# Altium integrated library LEMO Unipole And Multipole Type Connectors.IntLib: 1566 symbols (part 9 of 13) (continued)
## PKB.M0.8GL.NG (continued)
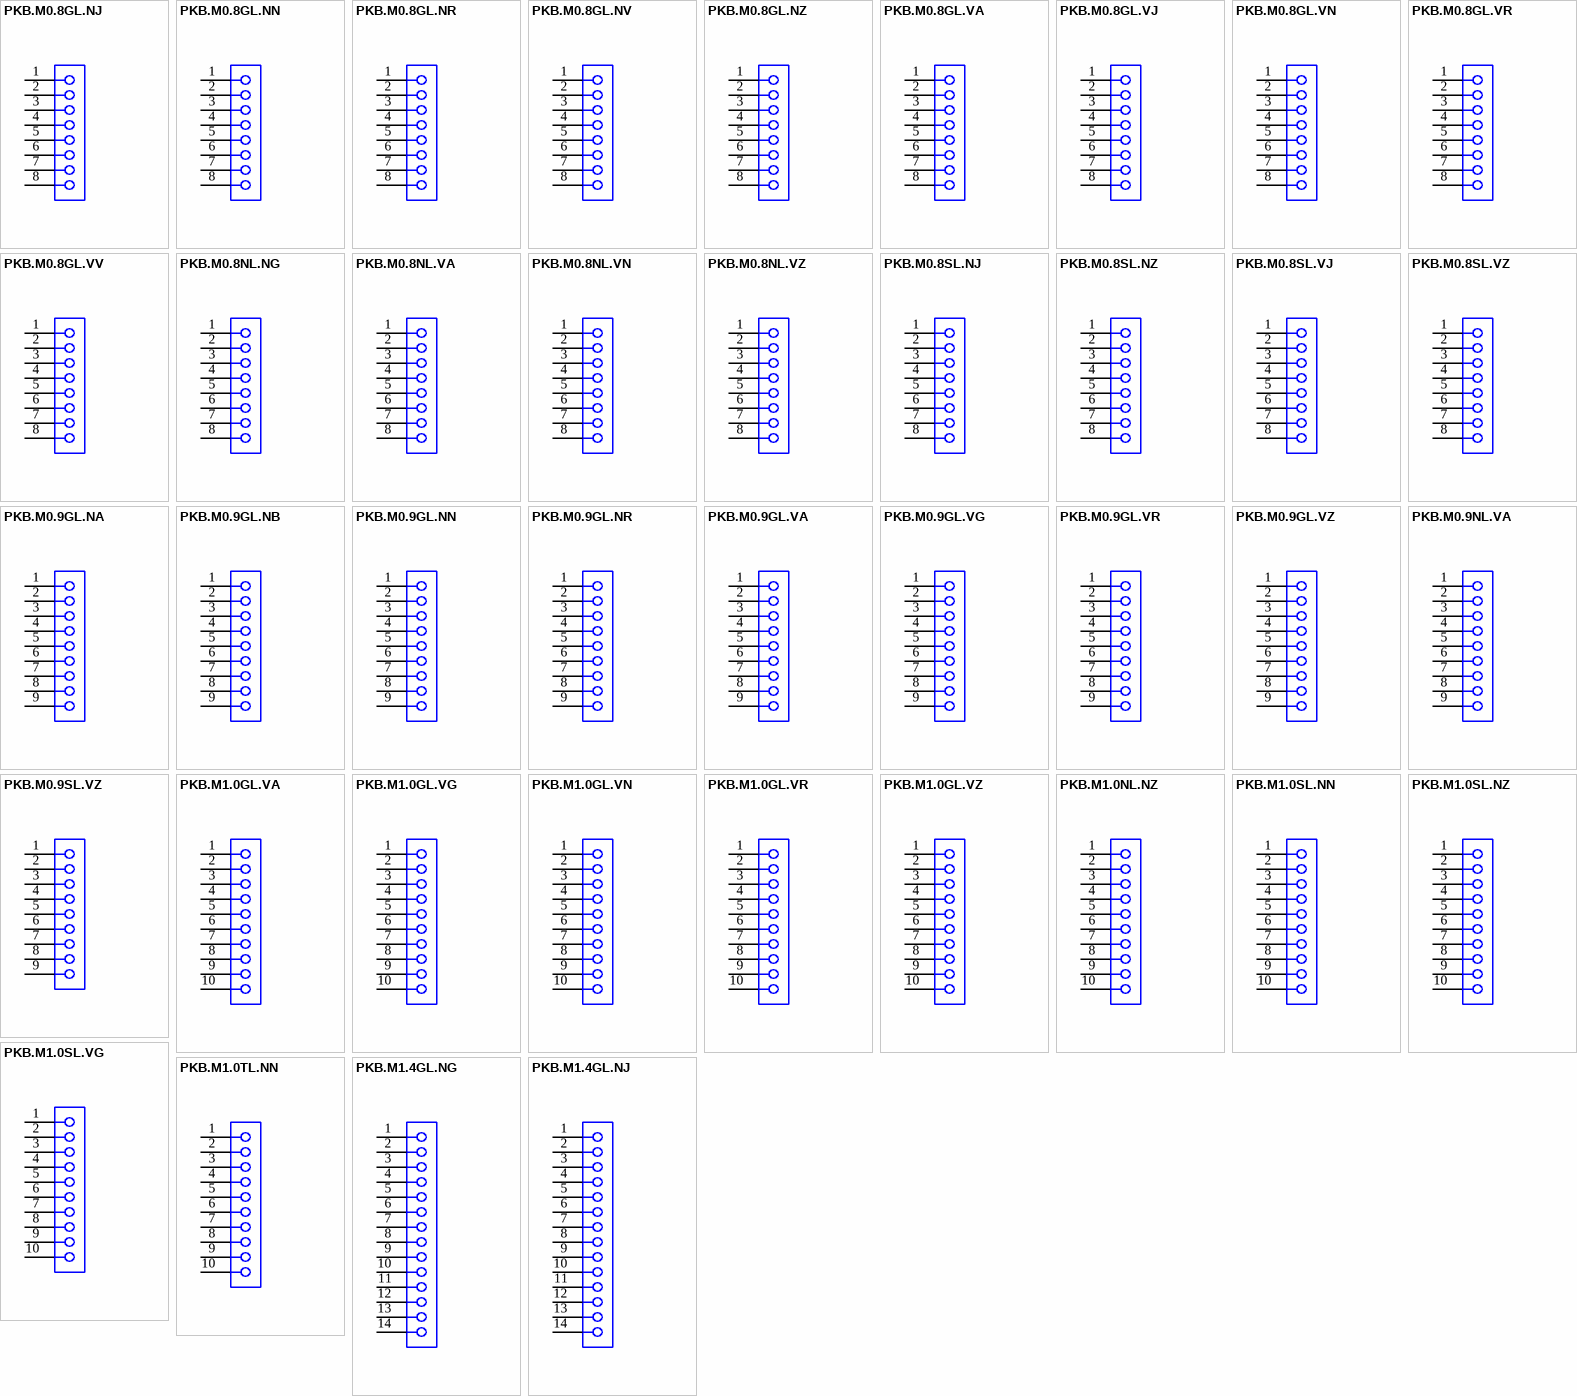
[diagram p29: symbols PKB.M0.8GL.NJ to PKB.M1.4GL.NJ]

## PKB.M0.8GL.NJ
designator J?
Fixed receptacle with two nuts (back panel mounting), straight print contacts, Key (B), P series, Multipole Type with 8 Contacts; Manufacturer: LEMO; PartNumber: PKB.M0.8GL.NJ; Number of contacts: 8; Contact Diameter: 0.7 mm; Test voltage (kV rms) Contact-Contact: 1.05; Rated Current(A): 5; DatasheetVersion: Jun-14; PackageReference: PKB.M0.8GL.NJ; PackageDescription: Fixed receptacle with two nuts (back panel mounting), straight print contacts, Key(B) for Printed Circuit; Supplier 1: Mouser; Supplier Part Number 1: 736-PKB.M0.8GL.NJ; Supplier 2: Digi-Key; Supplier Part Number 2: PKB.M0.8GL.NJ-ND; ComponentLink1Description: Manufacturer URL; ComponentLink1URL: http://www.lemo.com; ComponentLink2Description: Datasheet; ComponentLink2URL: http://intra.lemo.ch/catalog/ROW/UK_English/P_series_catalog.pdf
footprint PKB.M0.8GL.NJ (Socket, Female, Height 33.5 mm, Through hole)
pins: 1, 2, 3, 4, 5, 6, 7, 8

## PKB.M0.8GL.NN
designator J?
Fixed receptacle with two nuts (back panel mounting), straight print contacts, Key (B), P series, Multipole Type with 8 Contacts; Manufacturer: LEMO; PartNumber: PKB.M0.8GL.NN; Number of contacts: 8; Contact Diameter: 0.7 mm; Test voltage (kV rms) Contact-Contact: 1.05; Rated Current(A): 5; DatasheetVersion: Jun-14; PackageReference: PKB.M0.8GL.NN; PackageDescription: Fixed receptacle with two nuts (back panel mounting), straight print contacts, Key(B) for Printed Circuit; ComponentLink1Description: Manufacturer URL; ComponentLink1URL: http://www.lemo.com; ComponentLink2Description: Datasheet; ComponentLink2URL: http://intra.lemo.ch/catalog/ROW/UK_English/P_series_catalog.pdf
footprint PKB.M0.8GL.NN (Socket, Female, Height 33.5 mm, Through hole)
pins: 1, 2, 3, 4, 5, 6, 7, 8

## PKB.M0.8GL.NR
designator J?
Fixed receptacle with two nuts (back panel mounting), straight print contacts, Key (B), P series, Multipole Type with 8 Contacts; Manufacturer: LEMO; PartNumber: PKB.M0.8GL.NR; Number of contacts: 8; Contact Diameter: 0.7 mm; Test voltage (kV rms) Contact-Contact: 1.05; Rated Current(A): 5; DatasheetVersion: Jun-14; PackageReference: PKB.M0.8GL.NR; PackageDescription: Fixed receptacle with two nuts (back panel mounting), straight print contacts, Key(B) for Printed Circuit; ComponentLink1Description: Manufacturer URL; ComponentLink1URL: http://www.lemo.com; ComponentLink2Description: Datasheet; ComponentLink2URL: http://intra.lemo.ch/catalog/ROW/UK_English/P_series_catalog.pdf
footprint PKB.M0.8GL.NR (Socket, Female, Height 33.5 mm, Through hole)
pins: 1, 2, 3, 4, 5, 6, 7, 8

## PKB.M0.8GL.NV
designator J?
Fixed receptacle with two nuts (back panel mounting), straight print contacts, Key (B), P series, Multipole Type with 8 Contacts; Manufacturer: LEMO; PartNumber: PKB.M0.8GL.NV; Number of contacts: 8; Contact Diameter: 0.7 mm; Test voltage (kV rms) Contact-Contact: 1.05; Rated Current(A): 5; DatasheetVersion: Jun-14; PackageReference: PKB.M0.8GL.NV; PackageDescription: Fixed receptacle with two nuts (back panel mounting), straight print contacts, Key(B) for Printed Circuit; ComponentLink1Description: Manufacturer URL; ComponentLink1URL: http://www.lemo.com; ComponentLink2Description: Datasheet; ComponentLink2URL: http://intra.lemo.ch/catalog/ROW/UK_English/P_series_catalog.pdf
footprint PKB.M0.8GL.NV (Socket, Female, Height 33.5 mm, Through hole)
pins: 1, 2, 3, 4, 5, 6, 7, 8

## PKB.M0.8GL.NZ
designator J?
Fixed receptacle with 1 nut (without 2nd front nut), Key (B), P series, Multipole Type with 8 Contacts; Manufacturer: LEMO; PartNumber: PKB.M0.8GL.NZ; Number of contacts: 8; Contact Diameter: 0.7 mm; Test voltage (kV rms) Contact-Contact: 1.05; Rated Current(A): 5; DatasheetVersion: Jun-14; PackageReference: PKB.M0.8GL.NZ; PackageDescription: Fixed receptacle with 1 nut (without 2nd front nut), Key(B) for Printed Circuit; Supplier 1: Mouser; Supplier Part Number 1: 736-PKB.M0.8GL.NZ; Supplier 2: Digi-Key; Supplier Part Number 2: PKB.M0.8GL.NZ-ND; ComponentLink1Description: Manufacturer URL; ComponentLink1URL: http://www.lemo.com; ComponentLink2Description: Datasheet; ComponentLink2URL: http://intra.lemo.ch/catalog/ROW/UK_English/P_series_catalog.pdf
footprint PKB.M0.8GL.NZ (Socket, Female, Height 25 mm, Through hole)
pins: 1, 2, 3, 4, 5, 6, 7, 8

## PKB.M0.8GL.VA
designator J?
Fixed receptacle with two nuts (back panel mounting), 90° print contacts, Key (B), P series, Multipole Type with 8 Contacts; Manufacturer: LEMO; PartNumber: PKB.M0.8GL.VA; Number of contacts: 8; Contact Diameter: 0.7 mm; Test voltage (kV rms) Contact-Contact: 1.05; Rated Current(A): 5; DatasheetVersion: Jun-14; PackageReference: PKB.M0.8GL.VA; PackageDescription: Fixed receptacle with two nuts (back panel mounting), 90° print contacts, Key(B) for Printed Circuit; ComponentLink1Description: Manufacturer URL; ComponentLink1URL: http://www.lemo.com; ComponentLink2Description: Datasheet; ComponentLink2URL: http://intra.lemo.ch/catalog/ROW/UK_English/P_series_catalog.pdf
footprint PKB.M0.8GL.VA (Socket, Female, Through hole)
pins: 1, 2, 3, 4, 5, 6, 7, 8

## PKB.M0.8GL.VJ
designator J?
Fixed receptacle with two nuts (back panel mounting), 90° print contacts, Key (B), P series, Multipole Type with 8 Contacts; Manufacturer: LEMO; PartNumber: PKB.M0.8GL.VJ; Number of contacts: 8; Contact Diameter: 0.7 mm; Test voltage (kV rms) Contact-Contact: 1.05; Rated Current(A): 5; DatasheetVersion: Jun-14; PackageReference: PKB.M0.8GL.VJ; PackageDescription: Fixed receptacle with two nuts (back panel mounting), 90° print contacts, Key(B) for Printed Circuit; ComponentLink1Description: Manufacturer URL; ComponentLink1URL: http://www.lemo.com; ComponentLink2Description: Datasheet; ComponentLink2URL: http://intra.lemo.ch/catalog/ROW/UK_English/P_series_catalog.pdf
footprint PKB.M0.8GL.VJ (Socket, Female, Height 33.5 mm, Through hole)
pins: 1, 2, 3, 4, 5, 6, 7, 8

## PKB.M0.8GL.VN
designator J?
Fixed receptacle with two nuts (back panel mounting), 90° print contacts, Key (B), P series, Multipole Type with 8 Contacts; Manufacturer: LEMO; PartNumber: PKB.M0.8GL.VN; Number of contacts: 8; Contact Diameter: 0.7 mm; Test voltage (kV rms) Contact-Contact: 1.05; Rated Current(A): 5; DatasheetVersion: Jun-14; PackageReference: PKB.M0.8GL.VN; PackageDescription: Fixed receptacle with two nuts (back panel mounting), 90° print contacts, Key(B) for Printed Circuit; ComponentLink1Description: Manufacturer URL; ComponentLink1URL: http://www.lemo.com; ComponentLink2Description: Datasheet; ComponentLink2URL: http://intra.lemo.ch/catalog/ROW/UK_English/P_series_catalog.pdf
footprint PKB.M0.8GL.VN (Socket, Female, Height 33.5 mm, Through hole)
pins: 1, 2, 3, 4, 5, 6, 7, 8

## PKB.M0.8GL.VR
designator J?
Fixed receptacle with two nuts (back panel mounting), 90° print contacts, Key (B), P series, Multipole Type with 8 Contacts; Manufacturer: LEMO; PartNumber: PKB.M0.8GL.VR; Number of contacts: 8; Contact Diameter: 0.7 mm; Test voltage (kV rms) Contact-Contact: 1.05; Rated Current(A): 5; DatasheetVersion: Jun-14; PackageReference: PKB.M0.8GL.VR; PackageDescription: Fixed receptacle with two nuts (back panel mounting), 90° print contacts, Key(B) for Printed Circuit; ComponentLink1Description: Manufacturer URL; ComponentLink1URL: http://www.lemo.com; ComponentLink2Description: Datasheet; ComponentLink2URL: http://intra.lemo.ch/catalog/ROW/UK_English/P_series_catalog.pdf
footprint PKB.M0.8GL.VR (Socket, Female, Height 33.5 mm, Through hole)
pins: 1, 2, 3, 4, 5, 6, 7, 8

## PKB.M0.8GL.VV
designator J?
Fixed receptacle with two nuts (back panel mounting), 90° print contacts, Key (B), P series, Multipole Type with 8 Contacts; Manufacturer: LEMO; PartNumber: PKB.M0.8GL.VV; Number of contacts: 8; Contact Diameter: 0.7 mm; Test voltage (kV rms) Contact-Contact: 1.05; Rated Current(A): 5; DatasheetVersion: Jun-14; PackageReference: PKB.M0.8GL.VV; PackageDescription: Fixed receptacle with two nuts (back panel mounting), 90° print contacts, Key(B) for Printed Circuit; ComponentLink1Description: Manufacturer URL; ComponentLink1URL: http://www.lemo.com; ComponentLink2Description: Datasheet; ComponentLink2URL: http://intra.lemo.ch/catalog/ROW/UK_English/P_series_catalog.pdf
footprint PKB.M0.8GL.VV (Socket, Female, Height 33.5 mm, Through hole)
pins: 1, 2, 3, 4, 5, 6, 7, 8

## PKB.M0.8NL.NG
designator J?
Fixed receptacle with two nuts (back panel mounting), straight print contacts, Key (B), P series, Multipole Type with 8 Contacts; Manufacturer: LEMO; PartNumber: PKB.M0.8NL.NG; Number of contacts: 8; Contact Diameter: 0.7 mm; Test voltage (kV rms) Contact-Contact: 1.05; Rated Current(A): 5; DatasheetVersion: Jun-14; PackageReference: PKB.M0.8NL.NG; PackageDescription: Fixed receptacle with two nuts (back panel mounting), straight print contacts, Key(B) for Printed Circuit; ComponentLink1Description: Manufacturer URL; ComponentLink1URL: http://www.lemo.com; ComponentLink2Description: Datasheet; ComponentLink2URL: http://intra.lemo.ch/catalog/ROW/UK_English/P_series_catalog.pdf
footprint PKB.M0.8NL.NG (Socket, Female, Height 33.5 mm, Through hole)
pins: 1, 2, 3, 4, 5, 6, 7, 8

## PKB.M0.8NL.VA
designator J?
Fixed receptacle with two nuts (back panel mounting), 90° print contacts, Key (B), P series, Multipole Type with 8 Contacts; Manufacturer: LEMO; PartNumber: PKB.M0.8NL.VA; Number of contacts: 8; Contact Diameter: 0.7 mm; Test voltage (kV rms) Contact-Contact: 1.05; Rated Current(A): 5; DatasheetVersion: Jun-14; PackageReference: PKB.M0.8NL.VA; PackageDescription: Fixed receptacle with two nuts (back panel mounting), 90° print contacts, Key(B) for Printed Circuit; ComponentLink1Description: Manufacturer URL; ComponentLink1URL: http://www.lemo.com; ComponentLink2Description: Datasheet; ComponentLink2URL: http://intra.lemo.ch/catalog/ROW/UK_English/P_series_catalog.pdf
footprint PKB.M0.8NL.VA (Socket, Female, Height 33.5 mm, Through hole)
pins: 1, 2, 3, 4, 5, 6, 7, 8

## PKB.M0.8NL.VN
designator J?
Fixed receptacle with two nuts (back panel mounting), 90° print contacts, Key (B), P series, Multipole Type with 8 Contacts; Manufacturer: LEMO; PartNumber: PKB.M0.8NL.VN; Number of contacts: 8; Contact Diameter: 0.7 mm; Test voltage (kV rms) Contact-Contact: 1.05; Rated Current(A): 5; DatasheetVersion: Jun-14; PackageReference: PKB.M0.8NL.VN; PackageDescription: Fixed receptacle with two nuts (back panel mounting), 90° print contacts, Key(B) for Printed Circuit; ComponentLink1Description: Manufacturer URL; ComponentLink1URL: http://www.lemo.com; ComponentLink2Description: Datasheet; ComponentLink2URL: http://intra.lemo.ch/catalog/ROW/UK_English/P_series_catalog.pdf
footprint PKB.M0.8NL.VN (Socket, Female, Height 33.5 mm, Through hole)
pins: 1, 2, 3, 4, 5, 6, 7, 8

## PKB.M0.8NL.VZ
designator J?
Fixed receptacle with 1 nut (without 2nd front nut), Key (B), P series, Multipole Type with 8 Contacts; Manufacturer: LEMO; PartNumber: PKB.M0.8NL.VZ; Number of contacts: 8; Contact Diameter: 0.7 mm; Test voltage (kV rms) Contact-Contact: 1.05; Rated Current(A): 5; DatasheetVersion: Jun-14; PackageReference: PKB.M0.8NL.VZ; PackageDescription: Fixed receptacle with 1 nut (without 2nd front nut), Key(B) for Printed Circuit; ComponentLink1Description: Manufacturer URL; ComponentLink1URL: http://www.lemo.com; ComponentLink2Description: Datasheet; ComponentLink2URL: http://intra.lemo.ch/catalog/ROW/UK_English/P_series_catalog.pdf
footprint PKB.M0.8NL.VZ (Socket, Female, Height 33.5 mm, Through hole)
pins: 1, 2, 3, 4, 5, 6, 7, 8

## PKB.M0.8SL.NJ
designator J?
Fixed receptacle with two nuts (back panel mounting), straight print contacts, Key (B), P series, Multipole Type with 8 Contacts; Manufacturer: LEMO; PartNumber: PKB.M0.8SL.NJ; Number of contacts: 8; Contact Diameter: 0.7 mm; Test voltage (kV rms) Contact-Contact: 1.05; Rated Current(A): 5; DatasheetVersion: Jun-14; PackageReference: PKB.M0.8SL.NJ; PackageDescription: Fixed receptacle with two nuts (back panel mounting), straight print contacts, Key(B) for Printed Circuit; Supplier 1: Mouser; Supplier Part Number 1: 736-PKBM08SLNJ; Supplier 2: Digi-Key; Supplier Part Number 2: PKB.M0.8SL.NJ-ND; ComponentLink1Description: Manufacturer URL; ComponentLink1URL: http://www.lemo.com; ComponentLink2Description: Datasheet; ComponentLink2URL: http://intra.lemo.ch/catalog/ROW/UK_English/P_series_catalog.pdf
footprint PKB.M0.8SL.NJ (Socket, Female, Height 33.5 mm, Through hole)
pins: 1, 2, 3, 4, 5, 6, 7, 8

## PKB.M0.8SL.NZ
designator J?
Fixed receptacle with 1 nut (without 2nd front nut), Key (B), P series, Multipole Type with 8 Contacts; Manufacturer: LEMO; PartNumber: PKB.M0.8SL.NZ; Number of contacts: 8; Contact Diameter: 0.7 mm; Test voltage (kV rms) Contact-Contact: 1.05; Rated Current(A): 5; DatasheetVersion: Jun-14; PackageReference: PKB.M0.8SL.NZ; PackageDescription: Fixed receptacle with 1 nut (without 2nd front nut), Key(B) for Printed Circuit; Supplier 1: Mouser; Supplier Part Number 1: 736-PKBM08SLNZ; Supplier 2: Digi-Key; Supplier Part Number 2: PKB.M0.8SL.NZ-ND; ComponentLink1Description: Manufacturer URL; ComponentLink1URL: http://www.lemo.com; ComponentLink2Description: Datasheet; ComponentLink2URL: http://intra.lemo.ch/catalog/ROW/UK_English/P_series_catalog.pdf
footprint PKB.M0.8SL.NZ (Socket, Female, Height 25 mm, Through hole)
pins: 1, 2, 3, 4, 5, 6, 7, 8

## PKB.M0.8SL.VJ
designator J?
Fixed receptacle with two nuts (back panel mounting), 90° print contacts, Key (B), P series, Multipole Type with 8 Contacts; Manufacturer: LEMO; PartNumber: PKB.M0.8SL.VJ; Number of contacts: 8; Contact Diameter: 0.7 mm; Test voltage (kV rms) Contact-Contact: 1.05; Rated Current(A): 5; DatasheetVersion: Jun-14; PackageReference: PKB.M0.8SL.VJ; PackageDescription: Fixed receptacle with two nuts (back panel mounting), 90° print contacts, Key(B) for Printed Circuit; Supplier 1: Mouser; Supplier Part Number 1: 736-PKBM08SLVJ; Supplier 2: Digi-Key; Supplier Part Number 2: PKB.M0.8SL.VJ-ND; ComponentLink1Description: Manufacturer URL; ComponentLink1URL: http://www.lemo.com; ComponentLink2Description: Datasheet; ComponentLink2URL: http://intra.lemo.ch/catalog/ROW/UK_English/P_series_catalog.pdf
footprint PKB.M0.8SL.VJ (Socket, Female, Height 33.5 mm, Through hole)
pins: 1, 2, 3, 4, 5, 6, 7, 8

## PKB.M0.8SL.VZ
designator J?
Fixed receptacle with 1 nut (without 2nd front nut), Key (B), P series, Multipole Type with 8 Contacts; Manufacturer: LEMO; PartNumber: PKB.M0.8SL.VZ; Number of contacts: 8; Contact Diameter: 0.7 mm; Test voltage (kV rms) Contact-Contact: 1.05; Rated Current(A): 5; DatasheetVersion: Jun-14; PackageReference: PKB.M0.8SL.VZ; PackageDescription: Fixed receptacle with 1 nut (without 2nd front nut), Key(B) for Printed Circuit; Supplier 1: Mouser; Supplier Part Number 1: 736-PKBM08SLVZ; Supplier 2: Digi-Key; Supplier Part Number 2: PKB.M0.8SL.VZ-ND; ComponentLink1Description: Manufacturer URL; ComponentLink1URL: http://www.lemo.com; ComponentLink2Description: Datasheet; ComponentLink2URL: http://intra.lemo.ch/catalog/ROW/UK_English/P_series_catalog.pdf
footprint PKB.M0.8SL.VZ (Socket, Female, Height 33.5 mm, Through hole)
pins: 1, 2, 3, 4, 5, 6, 7, 8

## PKB.M0.9GL.NA
designator J?
Fixed receptacle with two nuts (back panel mounting), straight print contacts, Key (B), P series, Multipole Type with 9 Contacts; Manufacturer: LEMO; PartNumber: PKB.M0.9GL.NA; Number of contacts: 9; Contact Diameter: 0.5 mm; Test voltage (kV rms) Contact-Contact: 0.85; Rated Current(A): 3; DatasheetVersion: Jun-14; PackageReference: PKB.M0.9GL.NA; PackageDescription: Fixed receptacle with two nuts (back panel mounting), straight print contacts, Key(B) for Printed Circuit; ComponentLink1Description: Manufacturer URL; ComponentLink1URL: http://www.lemo.com; ComponentLink2Description: Datasheet; ComponentLink2URL: http://intra.lemo.ch/catalog/ROW/UK_English/P_series_catalog.pdf
footprint PKB.M0.9GL.NA (Socket, Female, Height 33.5 mm, Through hole)
pins: 1, 2, 3, 4, 5, 6, 7, 8, 9

## PKB.M0.9GL.NB
designator J?
Fixed receptacle with two nuts (back panel mounting), straight print contacts, Key (B), P series, Multipole Type with 9 Contacts; Manufacturer: LEMO; PartNumber: PKB.M0.9GL.NB; Number of contacts: 9; Contact Diameter: 0.5 mm; Test voltage (kV rms) Contact-Contact: 0.85; Rated Current(A): 3; DatasheetVersion: Jun-14; PackageReference: PKB.M0.9GL.NB; PackageDescription: Fixed receptacle with two nuts (back panel mounting), straight print contacts, Key(B) for Printed Circuit; ComponentLink1Description: Manufacturer URL; ComponentLink1URL: http://www.lemo.com; ComponentLink2Description: Datasheet; ComponentLink2URL: http://intra.lemo.ch/catalog/ROW/UK_English/P_series_catalog.pdf
footprint PKB.M0.9GL.NB (Socket, Female, Height 33.5 mm, Through hole)
pins: 1, 2, 3, 4, 5, 6, 7, 8, 9

## PKB.M0.9GL.NN
designator J?
Fixed receptacle with two nuts (back panel mounting), straight print contacts, Key (B), P series, Multipole Type with 9 Contacts; Manufacturer: LEMO; PartNumber: PKB.M0.9GL.NN; Number of contacts: 9; Contact Diameter: 0.5 mm; Test voltage (kV rms) Contact-Contact: 0.85; Rated Current(A): 3; DatasheetVersion: Jun-14; PackageReference: PKB.M0.9GL.NN; PackageDescription: Fixed receptacle with two nuts (back panel mounting), straight print contacts, Key(B) for Printed Circuit; ComponentLink1Description: Manufacturer URL; ComponentLink1URL: http://www.lemo.com; ComponentLink2Description: Datasheet; ComponentLink2URL: http://intra.lemo.ch/catalog/ROW/UK_English/P_series_catalog.pdf
footprint PKB.M0.9GL.NN (Socket, Female, Height 33.5 mm, Through hole)
pins: 1, 2, 3, 4, 5, 6, 7, 8, 9

## PKB.M0.9GL.NR
designator J?
Fixed receptacle with two nuts (back panel mounting), straight print contacts, Key (B), P series, Multipole Type with 9 Contacts; Manufacturer: LEMO; PartNumber: PKB.M0.9GL.NR; Number of contacts: 9; Contact Diameter: 0.5 mm; Test voltage (kV rms) Contact-Contact: 0.85; Rated Current(A): 3; DatasheetVersion: Jun-14; PackageReference: PKB.M0.9GL.NR; PackageDescription: Fixed receptacle with two nuts (back panel mounting), straight print contacts, Key(B) for Printed Circuit; ComponentLink1Description: Manufacturer URL; ComponentLink1URL: http://www.lemo.com; ComponentLink2Description: Datasheet; ComponentLink2URL: http://intra.lemo.ch/catalog/ROW/UK_English/P_series_catalog.pdf
footprint PKB.M0.9GL.NR (Socket, Female, Height 33.5 mm, Through hole)
pins: 1, 2, 3, 4, 5, 6, 7, 8, 9

## PKB.M0.9GL.VA
designator J?
Fixed receptacle with two nuts (back panel mounting), 90° print contacts, Key (B), P series, Multipole Type with 9 Contacts; Manufacturer: LEMO; PartNumber: PKB.M0.9GL.VA; Number of contacts: 9; Contact Diameter: 0.5 mm; Test voltage (kV rms) Contact-Contact: 0.85; Rated Current(A): 3; DatasheetVersion: Jun-14; PackageReference: PKB.M0.9GL.VA; PackageDescription: Fixed receptacle with two nuts (back panel mounting), 90° print contacts, Key(B) for Printed Circuit; ComponentLink1Description: Manufacturer URL; ComponentLink1URL: http://www.lemo.com; ComponentLink2Description: Datasheet; ComponentLink2URL: http://intra.lemo.ch/catalog/ROW/UK_English/P_series_catalog.pdf
footprint PKB.M0.9GL.VA (Socket, Female, Through hole)
pins: 1, 2, 3, 4, 5, 6, 7, 8, 9

## PKB.M0.9GL.VG
designator J?
Fixed receptacle with two nuts (back panel mounting), 90° print contacts, Key (B), P series, Multipole Type with 9 Contacts; Manufacturer: LEMO; PartNumber: PKB.M0.9GL.VG; Number of contacts: 9; Contact Diameter: 0.5 mm; Test voltage (kV rms) Contact-Contact: 0.85; Rated Current(A): 3; DatasheetVersion: Jun-14; PackageReference: PKB.M0.9GL.VG; PackageDescription: Fixed receptacle with two nuts (back panel mounting), 90° print contacts, Key(B) for Printed Circuit; ComponentLink1Description: Manufacturer URL; ComponentLink1URL: http://www.lemo.com; ComponentLink2Description: Datasheet; ComponentLink2URL: http://intra.lemo.ch/catalog/ROW/UK_English/P_series_catalog.pdf
footprint PKB.M0.9GL.VG (Socket, Female, Height 33.5 mm, Through hole)
pins: 1, 2, 3, 4, 5, 6, 7, 8, 9

## PKB.M0.9GL.VR
designator J?
Fixed receptacle with two nuts (back panel mounting), 90° print contacts, Key (B), P series, Multipole Type with 9 Contacts; Manufacturer: LEMO; PartNumber: PKB.M0.9GL.VR; Number of contacts: 9; Contact Diameter: 0.5 mm; Test voltage (kV rms) Contact-Contact: 0.85; Rated Current(A): 3; DatasheetVersion: Jun-14; PackageReference: PKB.M0.9GL.VR; PackageDescription: Fixed receptacle with two nuts (back panel mounting), 90° print contacts, Key(B) for Printed Circuit; ComponentLink1Description: Manufacturer URL; ComponentLink1URL: http://www.lemo.com; ComponentLink2Description: Datasheet; ComponentLink2URL: http://intra.lemo.ch/catalog/ROW/UK_English/P_series_catalog.pdf
footprint PKB.M0.9GL.VR (Socket, Female, Height 33.5 mm, Through hole)
pins: 1, 2, 3, 4, 5, 6, 7, 8, 9

## PKB.M0.9GL.VZ
designator J?
Fixed receptacle with 1 nut (without 2nd front nut), Key (B), P series, Multipole Type with 9 Contacts; Manufacturer: LEMO; PartNumber: PKB.M0.9GL.VZ; Number of contacts: 9; Contact Diameter: 0.5 mm; Test voltage (kV rms) Contact-Contact: 0.85; Rated Current(A): 3; DatasheetVersion: Jun-14; PackageReference: PKB.M0.9GL.VZ; PackageDescription: Fixed receptacle with 1 nut (without 2nd front nut), Key(B) for Printed Circuit; ComponentLink1Description: Manufacturer URL; ComponentLink1URL: http://www.lemo.com; ComponentLink2Description: Datasheet; ComponentLink2URL: http://intra.lemo.ch/catalog/ROW/UK_English/P_series_catalog.pdf
footprint PKB.M0.9GL.VZ (Socket, Female, Height 33.5 mm, Through hole)
pins: 1, 2, 3, 4, 5, 6, 7, 8, 9

## PKB.M0.9NL.VA
designator J?
Fixed receptacle with two nuts (back panel mounting), 90° print contacts, Key (B), P series, Multipole Type with 9 Contacts; Manufacturer: LEMO; PartNumber: PKB.M0.9NL.VA; Number of contacts: 9; Contact Diameter: 0.5 mm; Test voltage (kV rms) Contact-Contact: 0.85; Rated Current(A): 3; DatasheetVersion: Jun-14; PackageReference: PKB.M0.9NL.VA; PackageDescription: Fixed receptacle with two nuts (back panel mounting), 90° print contacts, Key(B) for Printed Circuit; ComponentLink1Description: Manufacturer URL; ComponentLink1URL: http://www.lemo.com; ComponentLink2Description: Datasheet; ComponentLink2URL: http://intra.lemo.ch/catalog/ROW/UK_English/P_series_catalog.pdf
footprint PKB.M0.9NL.VA (Socket, Female, Height 33.5 mm, Through hole)
pins: 1, 2, 3, 4, 5, 6, 7, 8, 9

## PKB.M0.9SL.VZ
designator J?
Fixed receptacle with 1 nut (without 2nd front nut), Key (B), P series, Multipole Type with 9 Contacts; Manufacturer: LEMO; PartNumber: PKB.M0.9SL.VZ; Number of contacts: 9; Contact Diameter: 0.5 mm; Test voltage (kV rms) Contact-Contact: 0.85; Rated Current(A): 3; DatasheetVersion: Jun-14; PackageReference: PKB.M0.9SL.VZ; PackageDescription: Fixed receptacle with 1 nut (without 2nd front nut), Key(B) for Printed Circuit; Supplier 1: Mouser; Supplier Part Number 1: 736-PKBM09SLVZ; Supplier 2: Digi-Key; Supplier Part Number 2: PKB.M0.9SL.VZ-ND; ComponentLink1Description: Manufacturer URL; ComponentLink1URL: http://www.lemo.com; ComponentLink2Description: Datasheet; ComponentLink2URL: http://intra.lemo.ch/catalog/ROW/UK_English/P_series_catalog.pdf
footprint PKB.M0.9SL.VZ (Socket, Female, Height 33.5 mm, Through hole)
pins: 1, 2, 3, 4, 5, 6, 7, 8, 9

## PKB.M1.0GL.VA
designator J?
Fixed receptacle with two nuts (back panel mounting), 90° print contacts, Key (B), P series, Multipole Type with 10 Contacts; Manufacturer: LEMO; PartNumber: PKB.M1.0GL.VA; Number of contacts: 10; Contact Diameter: 0.5 mm; Test voltage (kV rms) Contact-Contact: 0.85; Rated Current(A): 3; DatasheetVersion: Jun-14; PackageReference: PKB.M1.0GL.VA; PackageDescription: Fixed receptacle with two nuts (back panel mounting), 90° print contacts, Key(B) for Printed Circuit; ComponentLink1Description: Manufacturer URL; ComponentLink1URL: http://www.lemo.com; ComponentLink2Description: Datasheet; ComponentLink2URL: http://intra.lemo.ch/catalog/ROW/UK_English/P_series_catalog.pdf
footprint PKB.M1.0GL.VA (Socket, Female, Height 33.5 mm, Through hole)
pins: 1, 2, 3, 4, 5, 6, 7, 8, 9, 10

## PKB.M1.0GL.VG
designator J?
Fixed receptacle with two nuts (back panel mounting), 90° print contacts, Key (B), P series, Multipole Type with 10 Contacts; Manufacturer: LEMO; PartNumber: PKB.M1.0GL.VG; Number of contacts: 10; Contact Diameter: 0.5 mm; Test voltage (kV rms) Contact-Contact: 0.85; Rated Current(A): 3; DatasheetVersion: Jun-14; PackageReference: PKB.M1.0GL.VG; PackageDescription: Fixed receptacle with two nuts (back panel mounting), 90° print contacts, Key(B) for Printed Circuit; Supplier 1: Mouser; Supplier Part Number 1: 736-PKBM10GLVG; Supplier 2: Digi-Key; Supplier Part Number 2: PKB.M1.0GL.VG-ND; ComponentLink1Description: Manufacturer URL; ComponentLink1URL: http://www.lemo.com; ComponentLink2Description: Datasheet; ComponentLink2URL: http://intra.lemo.ch/catalog/ROW/UK_English/P_series_catalog.pdf
footprint PKB.M1.0GL.VG (Socket, Female, Height 33.5 mm, Through hole)
pins: 1, 2, 3, 4, 5, 6, 7, 8, 9, 10

## PKB.M1.0GL.VN
designator J?
Fixed receptacle with two nuts (back panel mounting), 90° print contacts, Key (B), P series, Multipole Type with 10 Contacts; Manufacturer: LEMO; PartNumber: PKB.M1.0GL.VN; Number of contacts: 10; Contact Diameter: 0.5 mm; Test voltage (kV rms) Contact-Contact: 0.85; Rated Current(A): 3; DatasheetVersion: Jun-14; PackageReference: PKB.M1.0GL.VN; PackageDescription: Fixed receptacle with two nuts (back panel mounting), 90° print contacts, Key(B) for Printed Circuit; ComponentLink1Description: Manufacturer URL; ComponentLink1URL: http://www.lemo.com; ComponentLink2Description: Datasheet; ComponentLink2URL: http://intra.lemo.ch/catalog/ROW/UK_English/P_series_catalog.pdf
footprint PKB.M1.0GL.VN (Socket, Female, Height 33.5 mm, Through hole)
pins: 1, 2, 3, 4, 5, 6, 7, 8, 9, 10

## PKB.M1.0GL.VR
designator J?
Fixed receptacle with two nuts (back panel mounting), 90° print contacts, Key (B),  series, Multipole Type with 10 Contacts; Manufacturer: LEMO; PartNumber: PKB.M1.0GL.VR; Number of contacts: 10; Contact Diameter: 0.5 mm; Test voltage (kV rms) Contact-Contact: 0.85; Rated Current(A): 3; DatasheetVersion: Jun-14; PackageReference: PKB.M1.0GL.VR; PackageDescription: Fixed receptacle with two nuts (back panel mounting), 90° print contacts, Key(B) for Printed Circuit; ComponentLink1Description: Manufacturer URL; ComponentLink1URL: http://www.lemo.com; ComponentLink2Description: Datasheet; ComponentLink2URL: http://intra.lemo.ch/catalog/ROW/UK_English/P_series_catalog.pdf
footprint PKB.M1.0GL.VR (Socket, Female, Height 33.5 mm, Through hole)
pins: 1, 2, 3, 4, 5, 6, 7, 8, 9, 10

## PKB.M1.0GL.VZ
designator J?
Fixed receptacle with 1 nut (without 2nd front nut), Key (B), P series, Multipole Type with 10 Contacts; Manufacturer: LEMO; PartNumber: PKB.M1.0GL.VZ; Number of contacts: 10; Contact Diameter: 0.5 mm; Test voltage (kV rms) Contact-Contact: 0.85; Rated Current(A): 3; DatasheetVersion: Jun-14; PackageReference: PKB.M1.0GL.VZ; PackageDescription: Fixed receptacle with 1 nut (without 2nd front nut), Key(B) for Printed Circuit; ComponentLink1Description: Manufacturer URL; ComponentLink1URL: http://www.lemo.com; ComponentLink2Description: Datasheet; ComponentLink2URL: http://intra.lemo.ch/catalog/ROW/UK_English/P_series_catalog.pdf
footprint PKB.M1.0GL.VZ (Socket, Female, Height 33.5 mm, Through hole)
pins: 1, 2, 3, 4, 5, 6, 7, 8, 9, 10

## PKB.M1.0NL.NZ
designator J?
Fixed receptacle with 1 nut (without 2nd front nut), Key (B), P series, Multipole Type with 10 Contacts; Manufacturer: LEMO; PartNumber: PKB.M1.0NL.NZ; Number of contacts: 10; Contact Diameter: 0.5 mm; Test voltage (kV rms) Contact-Contact: 0.85; Rated Current(A): 3; DatasheetVersion: Jun-14; PackageReference: PKB.M1.0NL.NZ; PackageDescription: Fixed receptacle with 1 nut (without 2nd front nut), Key(B) for Printed Circuit; ComponentLink1Description: Manufacturer URL; ComponentLink1URL: http://www.lemo.com; ComponentLink2Description: Datasheet; ComponentLink2URL: http://intra.lemo.ch/catalog/ROW/UK_English/P_series_catalog.pdf
footprint PKB.M1.0NL.NZ (Socket, Female, Height 25 mm, Through hole)
pins: 1, 2, 3, 4, 5, 6, 7, 8, 9, 10
